# Altium footprint library General.PcbLib: 128 footprints (part 7 of 8)
Each footprint in its own frame and in the unit in brackets; x right, y up, seen from the top. Pads: shape width x height; smd on the part's side, far side on the other; paste and mask are expansions set on the pad; w line width, h text height; cw(c..) or ccw(c..) is an arc to the next point about the centre after c.
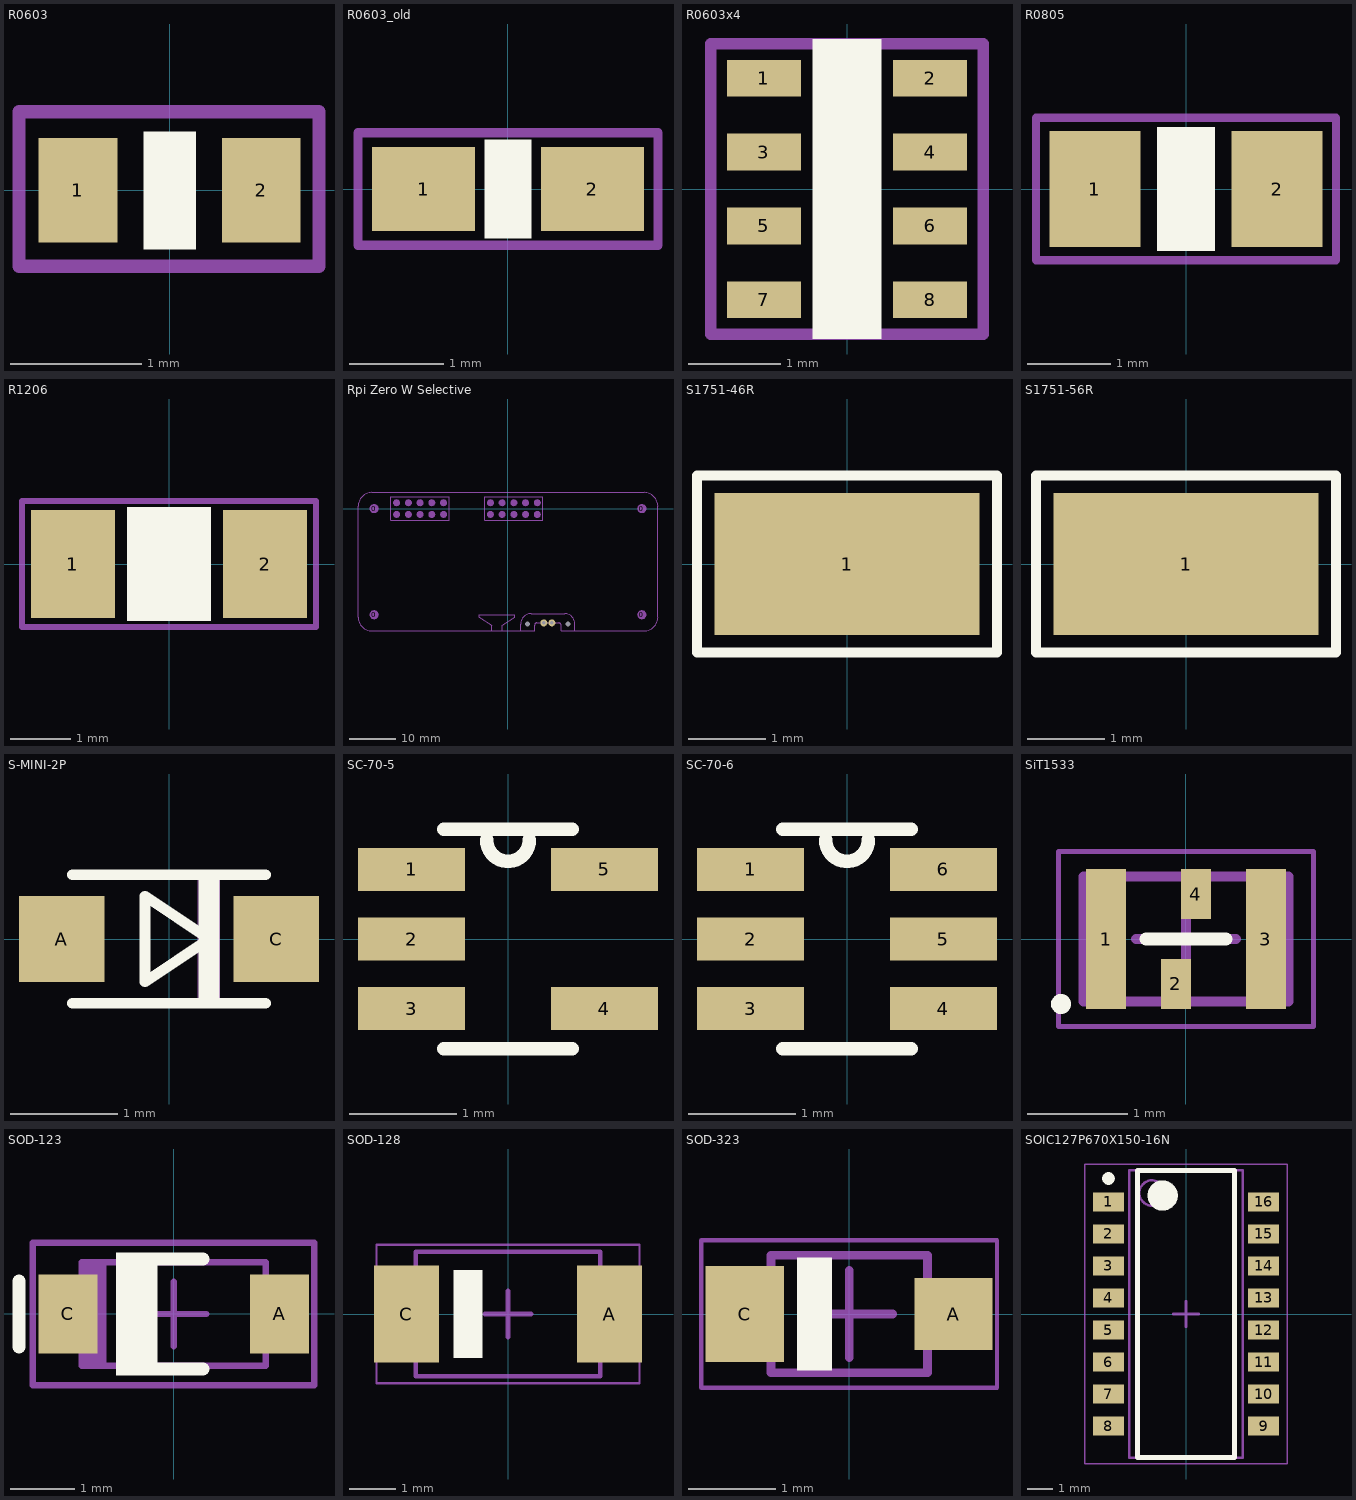
[diagram p6: the footprints below, top view; thin cyan lines are the x and y axes]

## R0603 [mm]
pads (2):
  rect 0.6x0.8 smd: 1(-0.7,0) 2(0.7,0)
Top Overlay:
  rectangle: -0.2,-0.45 0.2,0.45
Mechanical 15:
  lines w0.1: -1.15,-0.58 -1.15,-0.35 -1.15,0.15 -1.15,0.6 1.14,0.6 1.14,-0.14 1.14,-0.58 -1.15,-0.58
3D body "SW3dPS-0603 SMD Resistor.step": height 0.3, standoff 0, extent -0.8,-0.4 0.8,0.4

## R0603_old [mm]
pads (2):
  rect 1.1x0.9 smd: 1(-0.9,0) 2(0.9,0)
Top Overlay:
  rectangle: -0.25,-0.53 0.25,0.53
Mechanical 15:
  lines w0.1: -1.6,-0.6 1.6,-0.6 1.6,0.6 -1.6,0.6 -1.6,-0.6
3D body "SW3dPS-0603 SMD Resistor.step": height 0.3, standoff 0, extent -0.8,-0.4 0.8,0.4

## R0603x4 [mm]
pads (8):
  rect 0.8x0.4 smd: 1(-0.9,1.2) 2(0.9,1.2) 3(-0.9,0.4) 4(0.9,0.4) 5(-0.9,-0.4) 6(0.9,-0.4) 7(-0.9,-1.2) 8(0.9,-1.2)
Top Overlay:
  rectangle: -0.375,-1.625 0.375,1.625
Mechanical 15:
  lines w0.127: -1.475,-1.575 -1.475,1.575 1.475,1.575 1.475,-1.575 -1.475,-1.575
3D body "SW3dPS-RN164P.STEP": height 0.55, standoff 0, extent -0.8,-1.6 0.8,1.6

## R0805 [mm]
pads (2):
  rect 1.1x1.4 smd: 1(-1.1,0) 2(1.1,0)
Top Overlay:
  rectangle: -0.35,-0.75 0.35,0.75
Mechanical 15:
  lines w0.1: -1.81,-0.86 -1.81,0.86 1.81,0.86 1.81,-0.86 -1.81,-0.86
3D body "SW3dPS-0805 SMD Resistor.step": height 0.78, standoff 0, extent -1,-0.625 1,0.625

## R1206 [mm]
pads (2):
  rect 1.4x1.8 smd: 1(-1.6,0) 2(1.6,0)
Top Overlay:
  rectangle: -0.7,-0.95 0.7,0.95
Mechanical 15:
  lines w0.1: -2.451,-1.051 -2.451,1.051 2.451,1.051 2.451,-1.051 -2.451,-1.051
3D body "SW3dPS-1206 SMD Resistor.step": height 1, standoff 0, extent -1.6,-0.8 1.6,0.8

## Rpi Zero W Selective [mil]
pads (28):
  round 78.74 on Mech13: 0(-1141.73,-905.51) 0(-1141.73,0) 0(1141.73,-905.51) 0(1141.73,0)
  round 19.68 hole 43.31 unplated: 0(167.32,-984.25) 0(511.81,-984.25)
  round 60 on Mech15: 1(-950,-50) 2(-950,50) 3(-850,-50) 4(-850,50) 5(-750,-50) 6(-750,50) 7(-650,-50) 8(-650,50) 9(-550,-50) 10(-550,50) 17(-150,-50) 18(-150,50) 19(-50,-50) 20(-50,50) 21(50.79,-50) 22(50,50) 23(150,-50) 24(150,50) 25(250,-50) 26(250,50)
  round 60 hole 30: 41(374.02,-974.41) 42(305.12,-974.41)
Mechanical 13:
  lines w10: 108.27,-1043.31 108.27,-984.25 cw(c196.85,-984.25) 196.85,-895.67 482.28,-895.67 cw(c482.28,-984.25) 570.87,-984.25 570.87,-1043.31 ; -1279.53,-925.2 ccw(c-1161.42,-925.2) -1161.42,-1043.31 226.38,-1043.31 226.38,-994.09 cw(c246.06,-994.09) 246.06,-974.41 433.07,-974.41 cw(c433.07,-994.09) 452.76,-994.09 452.76,-1043.31 1023.62,-1043.31 1161.42,-1043.31 ccw(c1161.42,-925.2) 1279.53,-925.2 1279.53,19.68 ccw(c1161.42,19.68) 1161.42,137.8 -1161.42,137.8 ccw(c-1161.42,19.69) -1279.53,19.69 -1279.53,-925.2
Mechanical 15:
  region: -50,-959.65
  pour cut-out: -118.11,-964.57
  pour cut-out: 216.54,-1082.68
  lines w10: -1000,-100 -1000,100 ; -1000,-100 -500,-100 -500,100 ; -1000,-100 -1000,100 ; -1000,100 -500,100 ; -1000,100 -500,100 ; -200,-100 -200,100 ; -200,-100 -200,100 ; -200,-100 296.85,-100 296.85,100 -200,100 ; -246.06,-925.2 -246.06,-905.51 59.06,-905.51 59.06,-925.2 -49.21,-994.09 -49.21,-1043.31 -137.8,-1043.31 -137.8,-994.09 -246.06,-925.2
  text "ANT" at -147.64,-964.57 h39.37
Mechanical 16:
  region: -50,-959.65
  pour cut-out: -118.11,-964.57
  pour cut-out: 216.54,-1082.68
  pour cut-out: -167.32,-1012.2
  lines w10: -246.06,-925.2 -246.06,-905.51 59.06,-905.51 59.06,-925.2 -49.21,-994.09 -49.21,-1043.31 -137.8,-1043.31 -137.8,-994.09 -246.06,-925.2
  text "ANT" at -147.64,-964.57 h39.37
3D body "RapberryPiZero.stp": height 333.18, standoff 157.98, extent -1279.53,-1091.73 1279.53,137.8
3D body: height 236.22, standoff -236.22, extent 1799.21,-1082.68 1799.21,-1082.68
3D body "HDMI type C.STEP": height 435.28, standoff 104.57, extent -1064.95,-3322.49 -513.77,-866.14
3D body "User Library-microsd card.step": height 256.14, standoff 216.77, extent -1366.14,-602.6 -775.59,-169.05

## S1751-46R [mm]
pads (1):
  rect 3.45x1.85 smd mask+0.064: 1(0,0)
Top Overlay:
  lines w0.127: -1.95,-1.15 1.95,-1.15 1.95,1.15 -1.95,1.15 -1.95,-1.15
3D body "s1751-46r.stp": height 2, standoff -0.05, extent -1.625,-0.8 1.625,0.85

## S1751-56R [mm]
pads (1):
  rect 3.45x1.85 smd mask+0.064: 1(0,0)
Top Overlay:
  lines w0.127: -1.95,-1.15 -1.95,1.15 1.95,1.15 1.95,-1.15 -1.95,-1.15
3D body "s1751-46r.stp": height 2, standoff -0.05, extent -1.625,-0.8 1.625,0.85

## S-MINI-2P [mm]
pads (2):
  rect 0.8x0.8 smd: A(-1,0) C(1,0)
Top Overlay:
  region: 0.474,0.6 0.273,0.6 0.273,-0.6 0.474,-0.6
  lines w0.1: -0.225,-0.4 0.375,0 -0.225,0.4 -0.225,-0.4
  lines w0.102: -0.9,-0.6 0.9,-0.6 ; -0.9,0.6 0.9,0.6
Mechanical 1:
  lines w0: 0.275,-0.6 0.475,-0.6 0.475,0.6 0.275,0.6 0.275,-0.6
3D body: height 0.71, standoff 0, extent 0.276,-0.599 0.474,0.599
3D body: height 0.7, standoff 0, extent -0.85,-0.625 0.85,0.625

## SC-70-5 [mm]
pads (5):
  rect 1x0.4 smd: 1(-0.9,0.65) 2(-0.9,0) 3(-0.9,-0.65) 4(0.9,-0.65) 5(0.9,0.65)
Top Overlay:
  lines w0.127: -0.6,-1.025 0.6,-1.025 ; -0.6,1.025 0.6,1.025 ; -0.2,0.925 ccw(c0,0.925) 0.2,0.925
3D body "User Library-SC70-6.step": height 0.97, standoff 0.02, extent -1.05,-1 1.05,1

## SC-70-6 [mm]
pads (6):
  rect 1x0.4 smd: 1(-0.9,0.65) 2(-0.9,0) 3(-0.9,-0.65) 4(0.9,-0.65) 5(0.9,0) 6(0.9,0.65)
Top Overlay:
  lines w0.127: -0.6,-1.025 0.6,-1.025 ; -0.6,1.025 0.6,1.025 ; -0.2,0.925 ccw(c0,0.925) 0.2,0.925
3D body "User Library-SC70-6.step": height 0.97, standoff 0.02, extent -1.05,-1 1.05,1

## SiT1533 [mm] "DFN, 2-Leads, Body 1.20x2.00mm, Pitch 1.50mm, IPC Medium Density"
height 0.6
pads (4):
  rect 0.4x1.4 smd: 1(-0.8,0) 3(0.8,0)
  rect 0.3x0.5 smd: 2(-0.1,-0.45) 4(0.1,0.45)
Top Overlay:
  circle w0.1: c-1.25,-0.65 r0.05
  lines w0.127: -0.4,0 0.4,0
Mechanical 13:
  lines w0.1: -1.025,-0.625 -1.025,0.625 1.025,0.625 1.025,-0.625 -1.025,-0.625
Mechanical 15:
  lines w0.05: -1.275,-0.875 -1.275,0.875 1.275,0.875 1.275,-0.875 -1.275,-0.875
  lines w0.1: -0.5,0 0.5,0 ; 0,-0.5 0,0.5
3D body: height 0.6, standoff 0, extent -1.025,-0.625 1.025,0.625

## SOD-123 [mm] "Molded Diode, 2-Leads, Body 2.7x1.5mm, IPC Medium Density"
height 1.35
pads (2):
  rect 0.91x1.22 smd: A(1.635,0) C(-1.635,0)
Top Overlay:
  rectangle: -0.889,-0.95 -0.254,0.95
  lines w0.2: -2.39,-0.51 -2.39,0.51 ; -0.45,-0.85 0.45,-0.85 ; -0.45,0.85 0.45,0.85
Mechanical 13:
  rectangle: -1.42,-0.8 -1.038,0.8
  lines w0.1: -1.42,-0.8 1.42,-0.8 1.42,0.8 -1.42,0.8 -1.42,-0.8
Mechanical 15:
  lines w0.1: -0.5,0 0.5,0 ; 0,-0.5 0,0.5 ; -2.175,-1.1 2.175,-1.1 2.175,1.1 -2.175,1.1 -2.175,-1.1
3D body "User Library-SOD-123_DiodesInc.STEP": height 1.47, standoff 0.02, extent -1.925,-0.85 1.925,0.85

## SOD-128 [mm] "SOD-128 FL, 2-Leads, Body 2.50x4.70mm, IPC Medium Density"
height 1.1
pads (2):
  rect 1.4x2.1 smd: A(2.2,0) C(-2.2,0)
Top Overlay:
  rectangle: -1.185,-0.95 -0.55,0.95
Mechanical 13:
  lines w0.1: -2,-1.35 -2,1.35 2,1.35 2,-1.35 -2,-1.35
Mechanical 15:
  lines w0.05: -2.85,-1.5 -2.85,1.5 2.85,1.5 2.85,-1.5 -2.85,-1.5
  lines w0.1: -0.5,0 0.5,0 ; 0,-0.5 0,0.5
3D body "SOD-128.step": height 1.1, standoff 0, extent -2.35,-1.35 2.35,1.35

## SOD-323 [mm] "SOD-323, 2-Leads, Body 1.25x2.50mm, IPC Medium Density"
height 0.8
pads (2):
  rect 0.9x0.83 smd: A(1.2,0)
  rect 0.9x1.1 smd: C(-1.2,0)
Top Overlay:
  rectangle: -0.6,-0.65 -0.2,0.65
Mechanical 13:
  lines w0.1: -0.9,-0.675 -0.9,0.675 0.9,0.675 0.9,-0.675 -0.9,-0.675
Mechanical 15:
  lines w0.05: -1.7,-0.85 -1.7,0.85 1.7,0.85 1.7,-0.85 -1.7,-0.85
  lines w0.1: -0.5,0 0.5,0 ; 0,-0.5 0,0.5
3D body: height 0.8, standoff 0, extent -0.9,-0.675 0.9,0.675

## SOIC127P670X150-16N [mm] "SOIC, 16-Leads, Body 11.38x4.50mm, Pitch 1.27mm, IPC Medium Density"
height 1.5
pads (16):
  rect 1.245x0.76 smd: 1(-3.075,4.445) 2(-3.075,3.175) 3(-3.075,1.905) 4(-3.075,0.635) 5(-3.075,-0.635) 6(-3.075,-1.905) 7(-3.075,-3.175) 8(-3.075,-4.445) 9(3.075,-4.445) 10(3.075,-3.175) 11(3.075,-1.905) 12(3.075,-0.635) 13(3.075,0.635) 14(3.075,1.905) 15(3.075,3.175) 16(3.075,4.445)
Top Overlay:
  circle w0.6: c-0.925,4.7 r0.3
  circle w0.25: c-3.075,5.375 r0.125
  lines w0.2: -1.925,-5.7 1.925,-5.7 1.925,5.7 -1.925,5.7 -1.925,-5.7
Mechanical 13:
  circle w0.1: c-1.35,4.8 r0.5
  lines w0.1: -2.25,-5.7 2.25,-5.7 2.25,5.7 -2.25,5.7 -2.25,-5.7
Mechanical 15:
  lines w0.05: -4.025,-5.95 4.025,-5.95 4.025,5.95 -4.025,5.95 -4.025,-5.95
  lines w0.1: -0.5,0 0.5,0 ; 0,-0.5 0,0.5
3D body "SOIC127P670X150-16N.step": height 1.5, standoff 0, extent -3.355,-5.7 3.355,5.7